# Altium footprint library Library 3D.PcbLib: 288 footprints (part 1 of 18)
Each footprint in its own frame and in the unit in brackets; x right, y up, seen from the top. Pads: shape width x height; smd on the part's side, far side on the other; paste and mask are expansions set on the pad; w line width, h text height; cw(c..) or ccw(c..) is an arc to the next point about the centre after c.
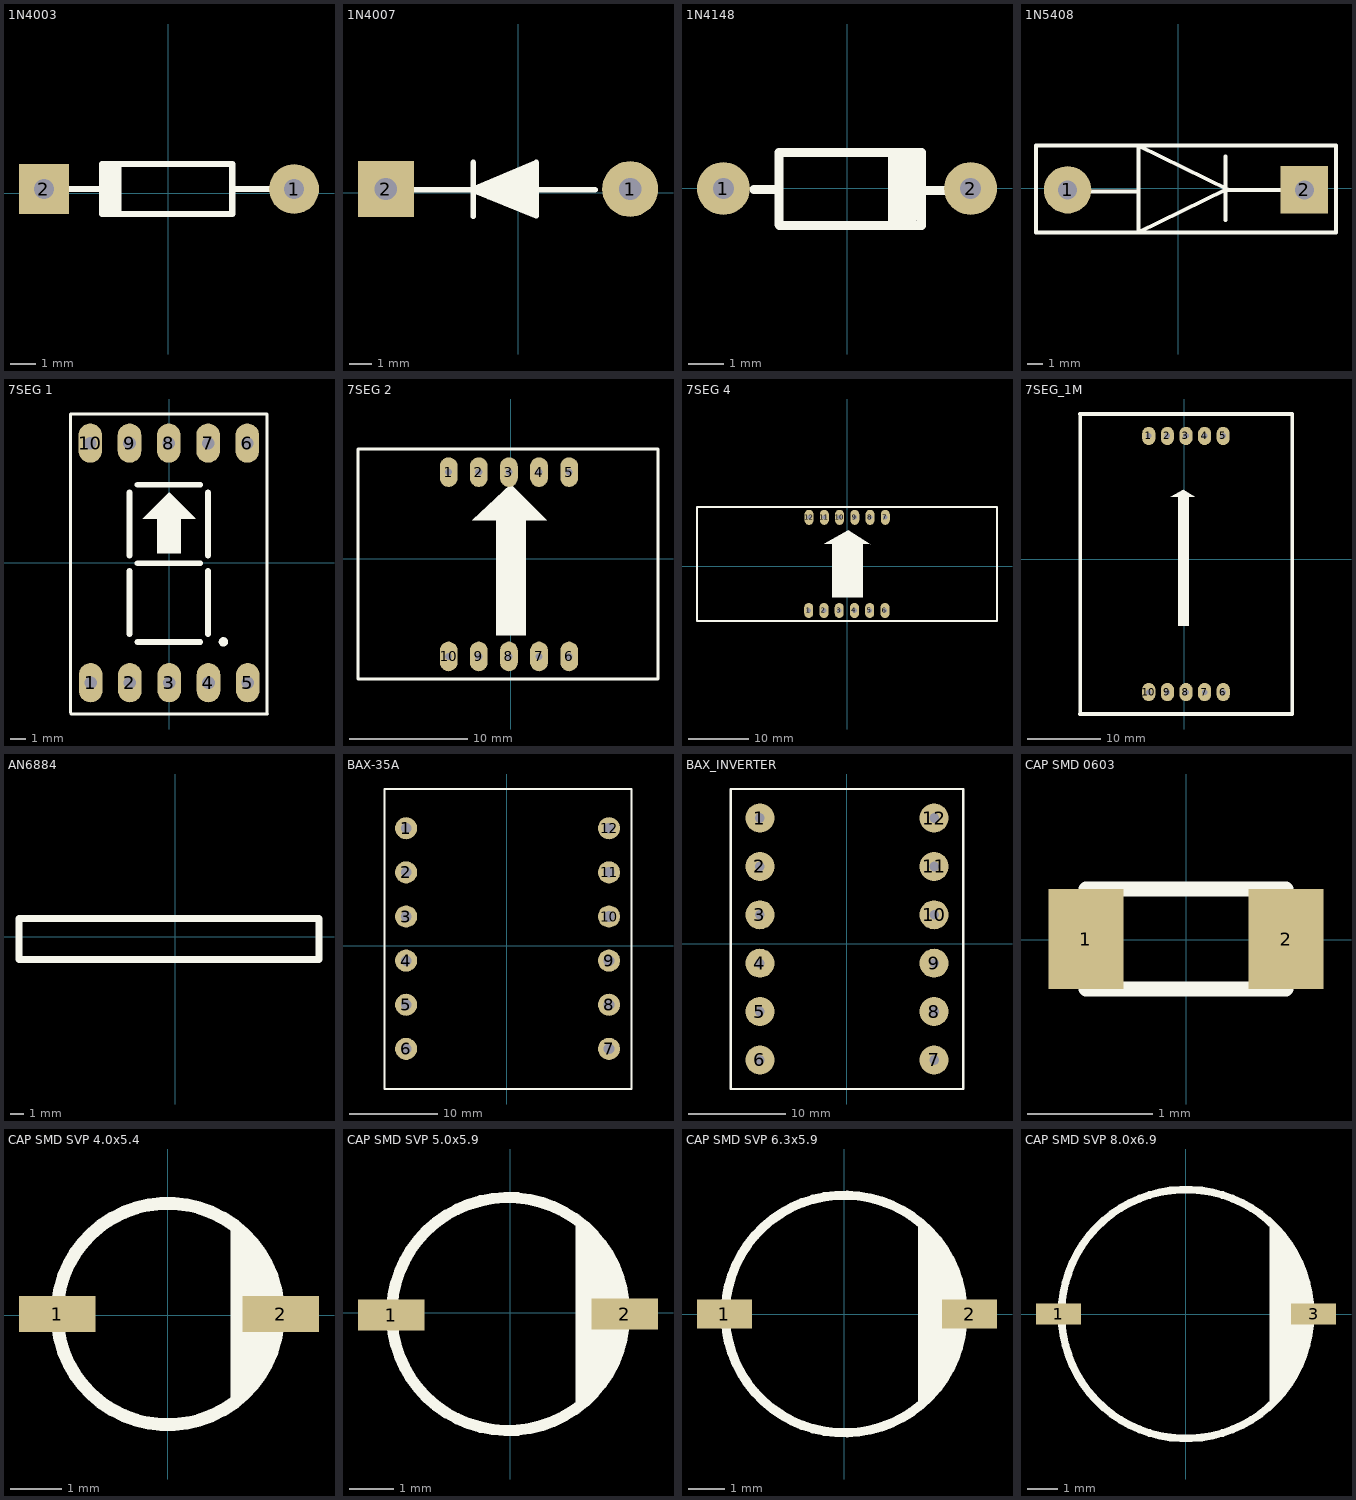
[diagram p0: the footprints below, top view; thin cyan lines are the x and y axes]

## 1N4003 [mm]
pads (2):
  round 2 hole 0.8: 1(5.05,0.175)
  rect 2x2 hole 0.8: 2(-4.975,0.175)
Top Overlay:
  rectangle: -2.65,-0.825 -1.875,1.175
  lines w0.254: -4.975,0.175 -2.4,0.175 ; 2.575,0.175 5.05,0.175 ; -2.65,-0.825 2.575,-0.825 2.575,1.175 -2.65,1.175 -2.65,-0.825
3D body "User Library-1N4003.STEP": height 3.01, standoff -2, extent -5.305,-0.835 5.405,1.185

## 1N4007 [mm]
pads (2):
  round 2.5 hole 1: 1(5.025,0.175)
  rect 2.5x2.5 hole 1: 2(-5.925,0.175)
Top Overlay:
  lines w0.254: -4.75,0.147 -2.058,0.147 ; -2.007,-1.047 -2.007,1.366 ; -1.727,0.071 0.711,1.112 ; -1.558,-0.056 0.813,0.934 ; -1.309,-0.158 0.736,0.731 ; -0.991,-0.209 0.711,0.528 ; -0.711,-0.31 0.686,0.299 ; -0.229,-0.539 0.736,-0.082 -0.381,-0.361 0.813,0.147 3.45,0.147 ; 0.076,-0.615 0.711,-0.31 ; 0.736,-0.818 0.533,-0.768 0.711,-0.564 ; -2.058,0.147 0.813,1.366 0.813,-1.022 -2.058,0.147 ; 0.711,-0.564 0.33,-0.666 0.711,-0.564
3D body "1N4007P11.STEP": height 3.36, standoff -2.39, extent -6.3,-1.075 5.4,1.425

## 1N4148 [mm]
pads (2):
  round 1.5 hole 0.6: 1(-3.523,-0.004) 2(3.502,-0.004)
Top Overlay:
  lines w0.254: -2.648,-0.029 -1.948,-0.029 ; 1.277,-0.954 1.277,0.921 ; 1.477,-0.929 1.477,0.996 ; 1.702,-1.004 1.702,1.021 ; 1.877,-0.829 1.877,0.846 ; 2.102,-0.054 2.802,-0.054 ; 2.102,1.021 2.102,-1.054 -1.923,-1.054 -1.948,-1.029 -1.948,1.021 2.102,1.021 ; 2.102,1.021 2.102,1.021
3D body "User Library-1n4148-1.STEP": height 3, standoff -3.5, extent -3.75,-1 3.75,1

## 1N5408 [mm]
pads (2):
  round 3 hole 1.2: 1(-7,-0.1)
  rect 3x3 hole 1.2: 2(8,-0.1)
Top Overlay:
  lines w0.254: -6.4,-0.2 -2.5,-0.2 ; 3,-2 3,2 ; 3,-0.1 -2.5,-2.8 -2.5,2.696 3.196,-0.1 6.8,-0.1 ; -9,-2.8 -9,2.7 10,2.7 10,-2.8 -9,-2.8
3D body "1N5408.STEP": height 6.56, standoff -10.83, extent -7.591,-2.467 8.609,2.325

## 7SEG 1 [mil]
pads (10):
  oval 60x100 hole 32: 1(-200.77,-305.18) 2(-100.77,-305.18) 3(-0.77,-305.18) 4(99.23,-305.18) 5(199.23,-305.18) 6(198.23,304.82) 7(98.23,304.82) 8(-1.77,304.82) 9(-101.77,304.82) 10(-201.77,304.82)
Top Overlay:
  circle w12: c137.23,-201.18 r6
  region: -67.77,112.82 -1.77,178.82 0.23,178.82 65.23,113.82 65.23,112.82 28.23,112.82 28.23,24.82 -30.77,24.82 -30.77,112.82
  lines w7: -251.77,-380.91 -251.77,378.94 248.23,378.94 248.23,-380.91 ; -250.77,-384.91 249.23,-384.91
  lines w15: -101.77,-181.18 -101.77,-21.18 ; -101.77,-181.18 -101.77,-21.18 ; -101.77,-181.18 -101.77,-21.18 ; -101.77,-181.18 -101.77,-21.18 ; -101.77,-181.18 -101.77,-21.18 ; -101.77,-181.18 -101.77,-21.18 ; -101.77,-181.18 -101.77,-21.18 ; -101.77,-181.18 -101.77,-21.18 ; -101.77,18.82 -101.77,178.82 ; -101.77,18.82 -101.77,178.82 ; -101.77,18.82 -101.77,178.82 ; -101.77,18.82 -101.77,178.82 ; -101.77,18.82 -101.77,178.82 ; -101.77,18.82 -101.77,178.82 ; -101.77,18.82 -101.77,178.82 ; -101.77,18.82 -101.77,178.82 ; -81.77,-201.18 78.23,-201.18 ; -81.77,-201.18 78.23,-201.18 ; -81.77,-201.18 78.23,-201.18 ; -81.77,-201.18 78.23,-201.18 ; -81.77,-1.18 78.23,-1.18 ; -81.77,-1.18 78.23,-1.18 ; -81.77,-1.18 78.23,-1.18 ; -81.77,-1.18 78.23,-1.18 ; -81.77,-1.18 78.23,-1.18 ; -81.77,-1.18 78.23,-1.18 ; -81.77,-1.18 78.23,-1.18 ; -81.77,-1.18 78.23,-1.18 ; -81.77,198.82 78.23,198.82 ; -81.77,198.82 78.23,198.82 ; -81.77,198.82 78.23,198.82 ; -81.77,198.82 78.23,198.82 ; 98.23,-181.18 98.23,-21.18 ; 98.23,-181.18 98.23,-21.18 ; 98.23,-181.18 98.23,-21.18 ; 98.23,-181.18 98.23,-21.18 ; 98.23,-181.18 98.23,-21.18 ; 98.23,-181.18 98.23,-21.18 ; 98.23,-181.18 98.23,-21.18 ; 98.23,-181.18 98.23,-21.18 ; 98.23,18.82 98.23,178.82 ; 98.23,18.82 98.23,178.82 ; 98.23,18.82 98.23,178.82 ; 98.23,18.82 98.23,178.82 ; 98.23,18.82 98.23,178.82 ; 98.23,18.82 98.23,178.82 ; 98.23,18.82 98.23,178.82 ; 98.23,18.82 98.23,178.82
3D body "LED7 don.STEP": height 275.59, standoff -196.85, extent -247.43,-374.31 244.69,373.72

## 7SEG 2 [mm]
pads (10):
  oval 1.5x2.5 hole 0.6: 1(-5.25,7.293) 2(-2.71,7.293) 3(-0.17,7.293) 4(2.37,7.293) 5(4.91,7.293) 6(4.91,-8.25) 7(2.37,-8.25) 8(-0.17,-8.25) 9(-2.71,-8.25) 10(-5.25,-8.25)
Top Overlay:
  rectangle: -1.25,-6.475 1.25,3.25
  region: -3.25,3.25 3,3.25 0,6.25
  lines w0.254: -12.895,-10.157 -12.895,9.249 12.4,9.249 12.4,2.75 12.4,-10.157 -12.895,-10.157
3D body "LED7 doi.STEP": height 7, standoff -5, extent -12.695,-9.979 12.305,9.021

## 7SEG 4 [mm]
pads (12):
  oval 1.5x2.5 hole 0.762: 1(-6.381,-7.349) 2(-3.841,-7.349) 3(-1.301,-7.349) 4(1.239,-7.349) 5(3.779,-7.349) 6(6.319,-7.349) 7(6.37,8.17) 8(3.83,8.17) 9(1.29,8.17) 10(-1.25,8.17) 11(-3.79,8.17) 12(-6.33,8.17)
Top Overlay:
  rectangle: -2.469,-5.165 2.636,3.776
  region: -3.815,3.75 3.83,3.725 0.172,6.036
  lines w0.254: -25.005,9.897 24.995,9.897 24.995,-9.103 -25.005,-9.103 -25.005,9.815 -24.923,9.897
3D body "led7.STEP": height 7, standoff -5, extent -25.005,-9.103 24.995,9.897

## 7SEG_1M [mm]
pads (10):
  oval 1.8x2.5 hole 0.762: 1(-4.86,16.825) 2(-2.32,16.825) 3(0.22,16.825) 4(2.76,16.825) 5(5.3,16.825) 6(5.305,-18.175) 7(2.765,-18.175) 8(0.225,-18.175) 9(-2.315,-18.175) 10(-4.855,-18.175)
Top Overlay:
  rectangle: -0.9,-9.15 0.625,8.475
  region: -0.175,9.475 -1.85,8.5 1.425,8.5
  lines w0.5: -14.275,19.825 14.725,19.825 14.725,-21.175 -14.275,-21.175 -14.25,-21.15 -14.25,19.825
3D body "LED7Thanh 29x41.STEP": height 9, standoff -10, extent -14.275,-21.175 14.725,19.825

## AN6884 [mm]
Top Overlay:
  lines w0.5: -11.447,-1.649 -11.447,1.351 10.553,1.351 10.553,-1.649 -11.447,-1.649
3D body "AN6884.STEP": height 1.62, standoff -9.08, extent -11.447,-1.649 10.553,1.351

## BAX-35A [mm]
pads (12):
  round 2.5 hole 1.2: 1(-11.4,13.3) 2(-11.4,8.3) 3(-11.4,3.3) 4(-11.4,-1.7) 5(-11.4,-6.7) 6(-11.4,-11.7) 7(11.6,-11.7) 8(11.6,-6.7) 9(11.6,-1.7) 10(11.6,3.3) 11(11.6,8.3) 12(11.6,13.3)
Top Overlay:
  lines w0.254: -13.852,-16.25 14.148,-16.25 14.148,17.75 -13.852,17.75 -13.852,-16.25
3D body "BAX-PC.STEP": height 31.13, standoff -3.87, extent -13.852,-16.25 14.148,17.75

## BAX_INVERTER [mm]
pads (12):
  round 3 hole 1: 1(-9,13) 2(-9,8) 3(-9,3) 4(-9,-2) 5(-9,-7) 6(-9,-12) 7(9,-12) 8(9,-7) 9(9,-2) 10(9,3) 11(9,8) 12(9,13)
Top Overlay:
  lines w0.254: -11,16 12,16 12,-15 -12,-15 -12,1 -12,16 -10,16

## CAP SMD 0603 [mm]
pads (2):
  rect 0.6x0.8 smd: 1(-0.8,0.006) 2(0.8,0.006)
Top Overlay:
  lines w0.12: -0.8,-0.394 -0.8,-0.375 -0.8,0.406 0.8,0.406 0.8,-0.394 -0.8,-0.394
3D body "SW3dPS-0603 SMD Capacitor.STEP": height 0.3, standoff 0, extent -0.8,-0.394 0.8,0.406

## CAP SMD SVP 4.0x5.4 [mm]
pads (2):
  rect 1.5x0.7 smd: 1(-2.175,0.025) 2(2.225,0.025)
Top Overlay:
  circle w0.254: c0,0.025 r2.178
  region: 1.237,1.775 1.237,0.037 1.237,-1.755 0.925,-1.975 1.6,-1.5 2.05,-0.775 2.15,0.025 2.178,0.025 2.05,0.85 1.6,1.525 0.875,2.025
3D body "User Library-CAP SMD SVP 4_0x5_4.STEP": height 5.4, standoff 0, extent -2.5,-2.125 2.5,2.175

## CAP SMD SVP 5.0x5.9 [mm]
pads (2):
  rect 1.5x0.7 smd: 1(-2.675,-0.05) 2(2.568,-0.025)
Top Overlay:
  circle w0.254: c-0.05,-0.025 r2.618
  region: 1.475,2.025 1.475,-2.125 2.3,-1.175 2.568,-0.025 2.3,1.125
3D body "User Library-CAP SMD SVP 5_0x5_9.STEP": height 5.9, standoff 0, extent -3,-2.65 3,2.65

## CAP SMD SVP 6.3x5.9 [mm]
pads (2):
  rect 1.5x0.8 smd: 1(-3.275,0) 2(3.425,0)
Top Overlay:
  circle w0.254: c0,0 r3.25
  region: 2.025,2.5 2.025,-2.525 2.662,-1.887 3.075,-1.1 3.25,0 2.975,1.4
3D body "User Library-CAP SMD SVP 6_3x5_9.STEP": height 5.9, standoff 0, extent -3.65,-3.3 3.65,3.3

## CAP SMD SVP 8.0x6.9 [mm]
pads (2):
  rect 1.5x0.7 smd: 1(-4.25,0) 3(4.25,0)
Top Overlay:
  circle w0.254: c0,0 r4.15
  region: 2.8,3.075 2.8,-3.1 3.775,-1.75 4.25,0 3.775,1.75
3D body "User Library-CAP SMD SVP 8_0x6_9.STEP": height 6.9, standoff 0, extent -4.5,-4.15 4.5,4.15